# Altium footprint library 3.22-杂项.PcbLib: 985 footprints (part 33 of 64)
Each footprint in its own frame and in the unit in brackets; x right, y up, seen from the top. Pads: shape width x height; smd on the part's side, far side on the other; paste and mask are expansions set on the pad; w line width, h text height; cw(c..) or ccw(c..) is an arc to the next point about the centre after c.
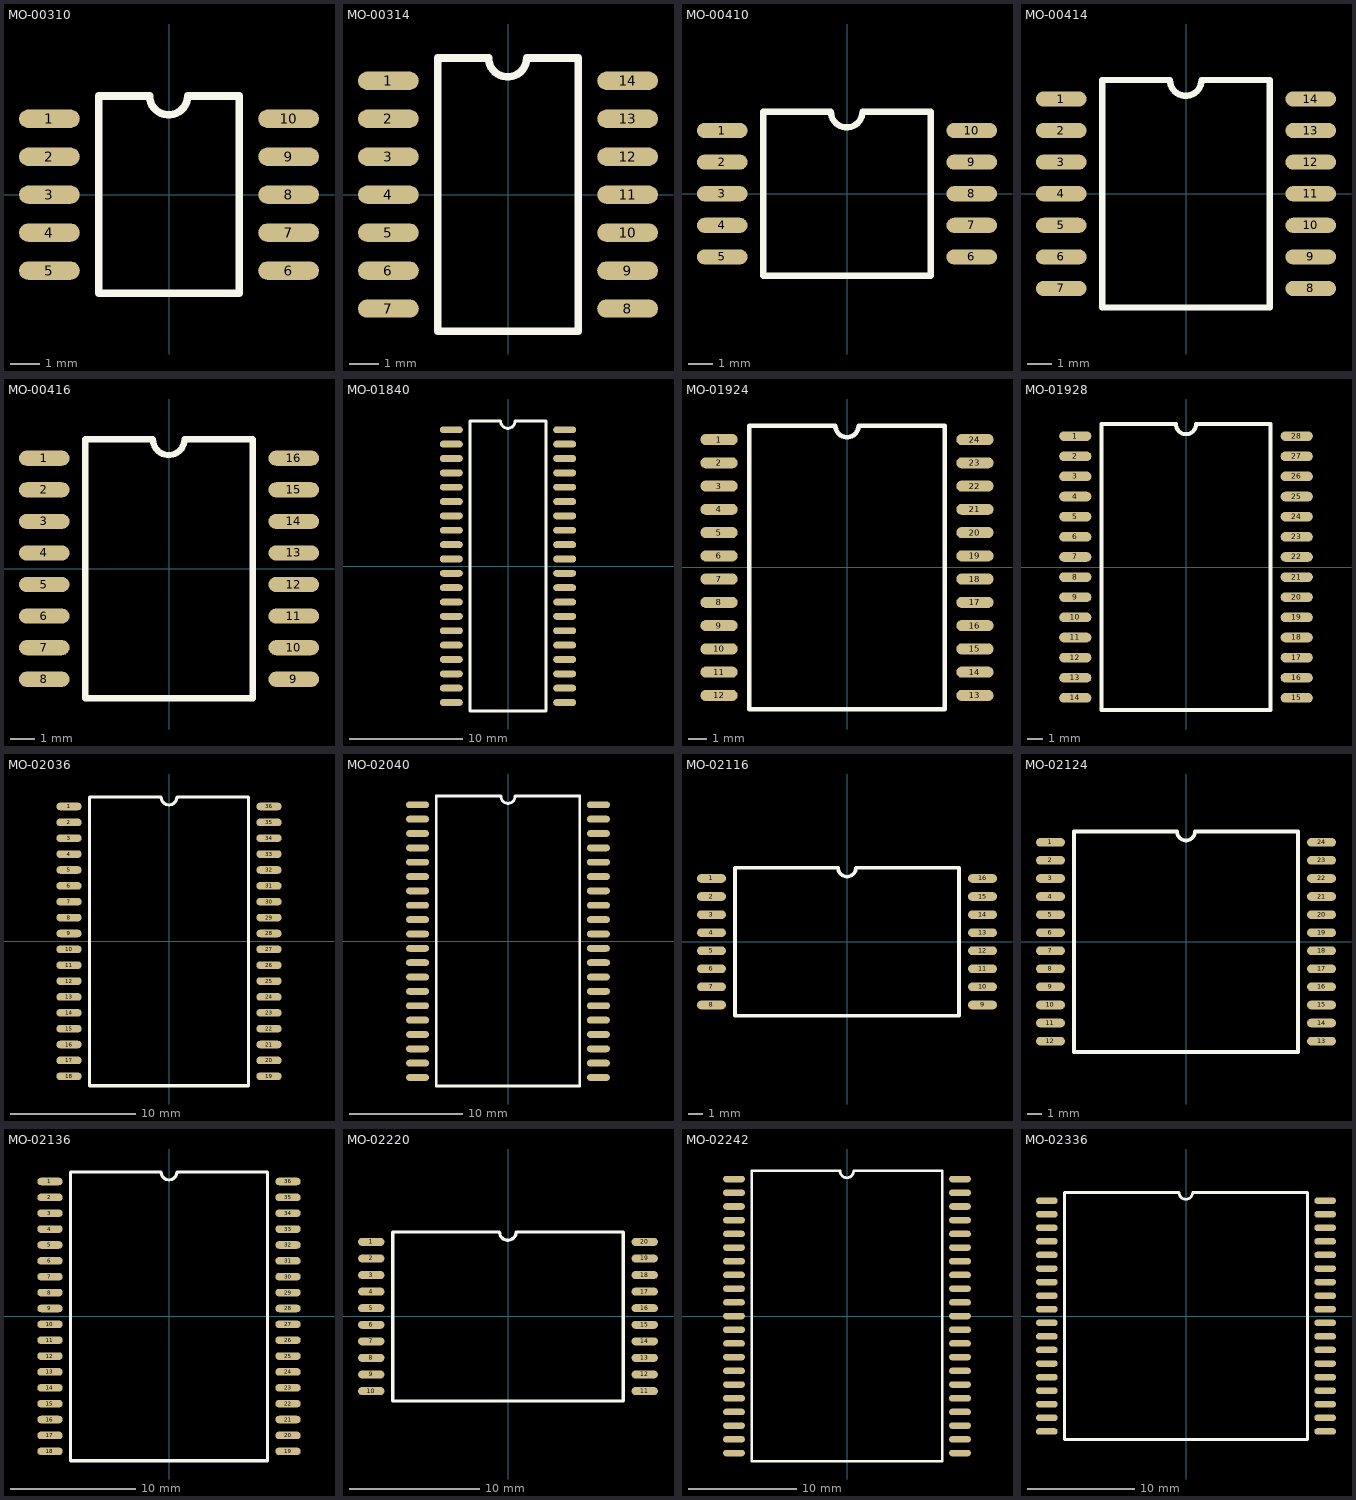
[diagram p32: the footprints below, top view; thin cyan lines are the x and y axes]

## MO-00310 [mil]
pads (10):
  oval 80x24 smd: 1(-157.5,100) 2(-157.5,50) 3(-157.5,0) 4(-157.5,-50) 5(-157.5,-100) 6(157.5,-100) 7(157.5,-50) 8(157.5,0) 9(157.5,50) 10(157.5,100)
Top Overlay:
  lines w10: -92.5,-130 -92.5,130 -25.5,130 ccw(c-0.5,130) 24.5,130 92.5,130 92.5,-130 -92.5,-130

## MO-00314 [mil]
pads (14):
  oval 80x24 smd: 1(-157.5,150) 2(-157.5,100) 3(-157.5,50) 4(-157.5,0) 5(-157.5,-50) 6(-157.5,-100) 7(-157.5,-150) 8(157.5,-150) 9(157.5,-100) 10(157.5,-50) 11(157.5,0) 12(157.5,50) 13(157.5,100) 14(157.5,150)
Top Overlay:
  lines w10: -92.5,-180 -92.5,180 -25.5,180 ccw(c-0.5,180) 24.5,180 92.5,180 92.5,-180 -92.5,-180

## MO-00410 [mil]
pads (10):
  oval 80x24 smd: 1(-197.5,100) 2(-197.5,50) 3(-197.5,0) 4(-197.5,-50) 5(-197.5,-100) 6(197.5,-100) 7(197.5,-50) 8(197.5,0) 9(197.5,50) 10(197.5,100)
Top Overlay:
  lines w10: -132.5,-130 -132.5,130 -25.5,130 ccw(c-0.5,130) 24.5,130 132.5,130 132.5,-130 -132.5,-130

## MO-00414 [mil]
pads (14):
  oval 80x24 smd: 1(-197.5,150) 2(-197.5,100) 3(-197.5,50) 4(-197.5,0) 5(-197.5,-50) 6(-197.5,-100) 7(-197.5,-150) 8(197.5,-150) 9(197.5,-100) 10(197.5,-50) 11(197.5,0) 12(197.5,50) 13(197.5,100) 14(197.5,150)
Top Overlay:
  lines w10: -132.5,-180 132.5,-180 132.5,180 24.5,180 cw(c-0.5,180) -25.5,180 -132.5,180 -132.5,-180

## MO-00416 [mil]
pads (16):
  oval 80x24 smd: 1(-197.5,175) 2(-197.5,125) 3(-197.5,75) 4(-197.5,25) 5(-197.5,-25) 6(-197.5,-75) 7(-197.5,-125) 8(-197.5,-175) 9(197.5,-175) 10(197.5,-125) 11(197.5,-75) 12(197.5,-25) 13(197.5,25) 14(197.5,75) 15(197.5,125) 16(197.5,175)
Top Overlay:
  lines w10: -132.5,-205 -132.5,205 -25.5,205 ccw(c-0.5,205) 24.5,205 132.5,205 132.5,-205 -132.5,-205

## MO-01840 [mil]
pads (40):
  oval 80x24 smd: 1(-197.5,475) 2(-197.5,425) 3(-197.5,375) 4(-197.5,325) 5(-197.5,275) 6(-197.5,225) 7(-197.5,175) 8(-197.5,125) 9(-197.5,75) 10(-197.5,25) 11(-197.5,-25) 12(-197.5,-75) 13(-197.5,-125) 14(-197.5,-175) 15(-197.5,-225) 16(-197.5,-275) 17(-197.5,-325) 18(-197.5,-375) 19(-197.5,-425) 20(-197.5,-475) 21(197.5,-475) 22(197.5,-425) 23(197.5,-375) 24(197.5,-325) 25(197.5,-275) 26(197.5,-225) 27(197.5,-175) 28(197.5,-125) 29(197.5,-75) 30(197.5,-25) 31(197.5,25) 32(197.5,75) 33(197.5,125) 34(197.5,175) 35(197.5,225) 36(197.5,275) 37(197.5,325) 38(197.5,375) 39(197.5,425) 40(197.5,475)
Top Overlay:
  lines w10: -132.5,-505 132.5,-505 132.5,505 24.5,505 cw(c-0.5,505) -25.5,505 -132.5,505 -132.5,-505

## MO-01924 [mil]
pads (24):
  oval 80x24 smd: 1(-275,275) 2(-275,225) 3(-275,175) 4(-275,125) 5(-275,75) 6(-275,25) 7(-275,-25) 8(-275,-75) 9(-275,-125) 10(-275,-175) 11(-275,-225) 12(-275,-275) 13(275,-275) 14(275,-225) 15(275,-175) 16(275,-125) 17(275,-75) 18(275,-25) 19(275,25) 20(275,75) 21(275,125) 22(275,175) 23(275,225) 24(275,275)
Top Overlay:
  lines w10: -210,-305 -210,305 -25,305 ccw(c0,305) 25,305 210,305 210,-305 -210,-305

## MO-01928 [mil]
pads (28):
  oval 80x24 smd: 1(-275,325) 2(-275,275) 3(-275,225) 4(-275,175) 5(-275,125) 6(-275,75) 7(-275,25) 8(-275,-25) 9(-275,-75) 10(-275,-125) 11(-275,-175) 12(-275,-225) 13(-275,-275) 14(-275,-325) 15(275,-325) 16(275,-275) 17(275,-225) 18(275,-175) 19(275,-125) 20(275,-75) 21(275,-25) 22(275,25) 23(275,75) 24(275,125) 25(275,175) 26(275,225) 27(275,275) 28(275,325)
Top Overlay:
  lines w10: -210,-355 -210,355 -25,355 ccw(c0,355) 25,355 210,355 210,-355 -210,-355

## MO-02036 [mil]
pads (36):
  oval 80x24 smd: 1(-315,425) 2(-315,375) 3(-315,325) 4(-315,275) 5(-315,225) 6(-315,175) 7(-315,125) 8(-315,75) 9(-315,25) 10(-315,-25) 11(-315,-75) 12(-315,-125) 13(-315,-175) 14(-315,-225) 15(-315,-275) 16(-315,-325) 17(-315,-375) 18(-315,-425) 19(315,-425) 20(315,-375) 21(315,-325) 22(315,-275) 23(315,-225) 24(315,-175) 25(315,-125) 26(315,-75) 27(315,-25) 28(315,25) 29(315,75) 30(315,125) 31(315,175) 32(315,225) 33(315,275) 34(315,325) 35(315,375) 36(315,425)
Top Overlay:
  lines w10: -250,-455 250,-455 250,455 25,455 cw(c0,455) -25,455 -250,455 -250,-455

## MO-02040 [mil]
pads (40):
  oval 80x24 smd: 1(-315,475) 2(-315,425) 3(-315,375) 4(-315,325) 5(-315,275) 6(-315,225) 7(-315,175) 8(-315,125) 9(-315,75) 10(-315,25) 11(-315,-25) 12(-315,-75) 13(-315,-125) 14(-315,-175) 15(-315,-225) 16(-315,-275) 17(-315,-325) 18(-315,-375) 19(-315,-425) 20(-315,-475) 21(315,-475) 22(315,-425) 23(315,-375) 24(315,-325) 25(315,-275) 26(315,-225) 27(315,-175) 28(315,-125) 29(315,-75) 30(315,-25) 31(315,25) 32(315,75) 33(315,125) 34(315,175) 35(315,225) 36(315,275) 37(315,325) 38(315,375) 39(315,425) 40(315,475)
Top Overlay:
  lines w10: -250,-505 -250,505 -25,505 ccw(c0,505) 25,505 250,505 250,-505 -250,-505

## MO-02116 [mil]
pads (16):
  oval 80x24 smd: 1(-375,175) 2(-375,125) 3(-375,75) 4(-375,25) 5(-375,-25) 6(-375,-75) 7(-375,-125) 8(-375,-175) 9(375,-175) 10(375,-125) 11(375,-75) 12(375,-25) 13(375,25) 14(375,75) 15(375,125) 16(375,175)
Top Overlay:
  lines w10: -310,-205 310,-205 310,205 25,205 cw(c0,205) -25,205 -310,205 -310,-205

## MO-02124 [mil]
pads (24):
  oval 80x24 smd: 1(-375,275) 2(-375,225) 3(-375,175) 4(-375,125) 5(-375,75) 6(-375,25) 7(-375,-25) 8(-375,-75) 9(-375,-125) 10(-375,-175) 11(-375,-225) 12(-375,-275) 13(375,-275) 14(375,-225) 15(375,-175) 16(375,-125) 17(375,-75) 18(375,-25) 19(375,25) 20(375,75) 21(375,125) 22(375,175) 23(375,225) 24(375,275)
Top Overlay:
  lines w10: -310,-305 310,-305 310,305 25,305 cw(c0,305) -25,305 -310,305 -310,-305

## MO-02136 [mil]
pads (36):
  oval 80x24 smd: 1(-375,425) 2(-375,375) 3(-375,325) 4(-375,275) 5(-375,225) 6(-375,175) 7(-375,125) 8(-375,75) 9(-375,25) 10(-375,-25) 11(-375,-75) 12(-375,-125) 13(-375,-175) 14(-375,-225) 15(-375,-275) 16(-375,-325) 17(-375,-375) 18(-375,-425) 19(375,-425) 20(375,-375) 21(375,-325) 22(375,-275) 23(375,-225) 24(375,-175) 25(375,-125) 26(375,-75) 27(375,-25) 28(375,25) 29(375,75) 30(375,125) 31(375,175) 32(375,225) 33(375,275) 34(375,325) 35(375,375) 36(375,425)
Top Overlay:
  lines w10: -310,-455 -310,455 -25,455 ccw(c0,455) 25,455 310,455 310,-455 -310,-455

## MO-02220 [mil]
pads (20):
  oval 80x24 smd: 1(-412.5,225) 2(-412.5,175) 3(-412.5,125) 4(-412.5,75) 5(-412.5,25) 6(-412.5,-25) 7(-412.5,-75) 8(-412.5,-125) 9(-412.5,-175) 10(-412.5,-225) 11(412.5,-225) 12(412.5,-175) 13(412.5,-125) 14(412.5,-75) 15(412.5,-25) 16(412.5,25) 17(412.5,75) 18(412.5,125) 19(412.5,175) 20(412.5,225)
Top Overlay:
  lines w10: -347.5,-255 -347.5,255 -25.5,255 ccw(c-0.5,255) 24.5,255 347.5,255 347.5,-255 -347.5,-255

## MO-02242 [mil]
pads (42):
  oval 80x24 smd: 1(-412.5,500) 2(-412.5,450) 3(-412.5,400) 4(-412.5,350) 5(-412.5,300) 6(-412.5,250) 7(-412.5,200) 8(-412.5,150) 9(-412.5,100) 10(-412.5,50) 11(-412.5,0) 12(-412.5,-50) 13(-412.5,-100) 14(-412.5,-150) 15(-412.5,-200) 16(-412.5,-250) 17(-412.5,-300) 18(-412.5,-350) 19(-412.5,-400) 20(-412.5,-450) 21(-412.5,-500) 22(412.5,-500) 23(412.5,-450) 24(412.5,-400) 25(412.5,-350) 26(412.5,-300) 27(412.5,-250) 28(412.5,-200) 29(412.5,-150) 30(412.5,-100) 31(412.5,-50) 32(412.5,0) 33(412.5,50) 34(412.5,100) 35(412.5,150) 36(412.5,200) 37(412.5,250) 38(412.5,300) 39(412.5,350) 40(412.5,400) 41(412.5,450) 42(412.5,500)
Top Overlay:
  lines w10: -347.5,-530 -347.5,530 -25.5,530 ccw(c-0.5,530) 24.5,530 347.5,530 347.5,-530 -347.5,-530

## MO-02336 [mil]
pads (36):
  oval 80x24 smd: 1(-512.5,425) 2(-512.5,375) 3(-512.5,325) 4(-512.5,275) 5(-512.5,225) 6(-512.5,175) 7(-512.5,125) 8(-512.5,75) 9(-512.5,25) 10(-512.5,-25) 11(-512.5,-75) 12(-512.5,-125) 13(-512.5,-175) 14(-512.5,-225) 15(-512.5,-275) 16(-512.5,-325) 17(-512.5,-375) 18(-512.5,-425) 19(512.5,-425) 20(512.5,-375) 21(512.5,-325) 22(512.5,-275) 23(512.5,-225) 24(512.5,-175) 25(512.5,-125) 26(512.5,-75) 27(512.5,-25) 28(512.5,25) 29(512.5,75) 30(512.5,125) 31(512.5,175) 32(512.5,225) 33(512.5,275) 34(512.5,325) 35(512.5,375) 36(512.5,425)
Top Overlay:
  lines w10: -447.5,-455 447.5,-455 447.5,455 24.5,455 cw(c-0.5,455) -25.5,455 -447.5,455 -447.5,-455